# Altium footprint library Library.PcbLib: 298 footprints (part 10 of 19)
Each footprint in its own frame and in the unit in brackets; x right, y up, seen from the top. Pads: shape width x height; smd on the part's side, far side on the other; paste and mask are expansions set on the pad; w line width, h text height; cw(c..) or ccw(c..) is an arc to the next point about the centre after c.
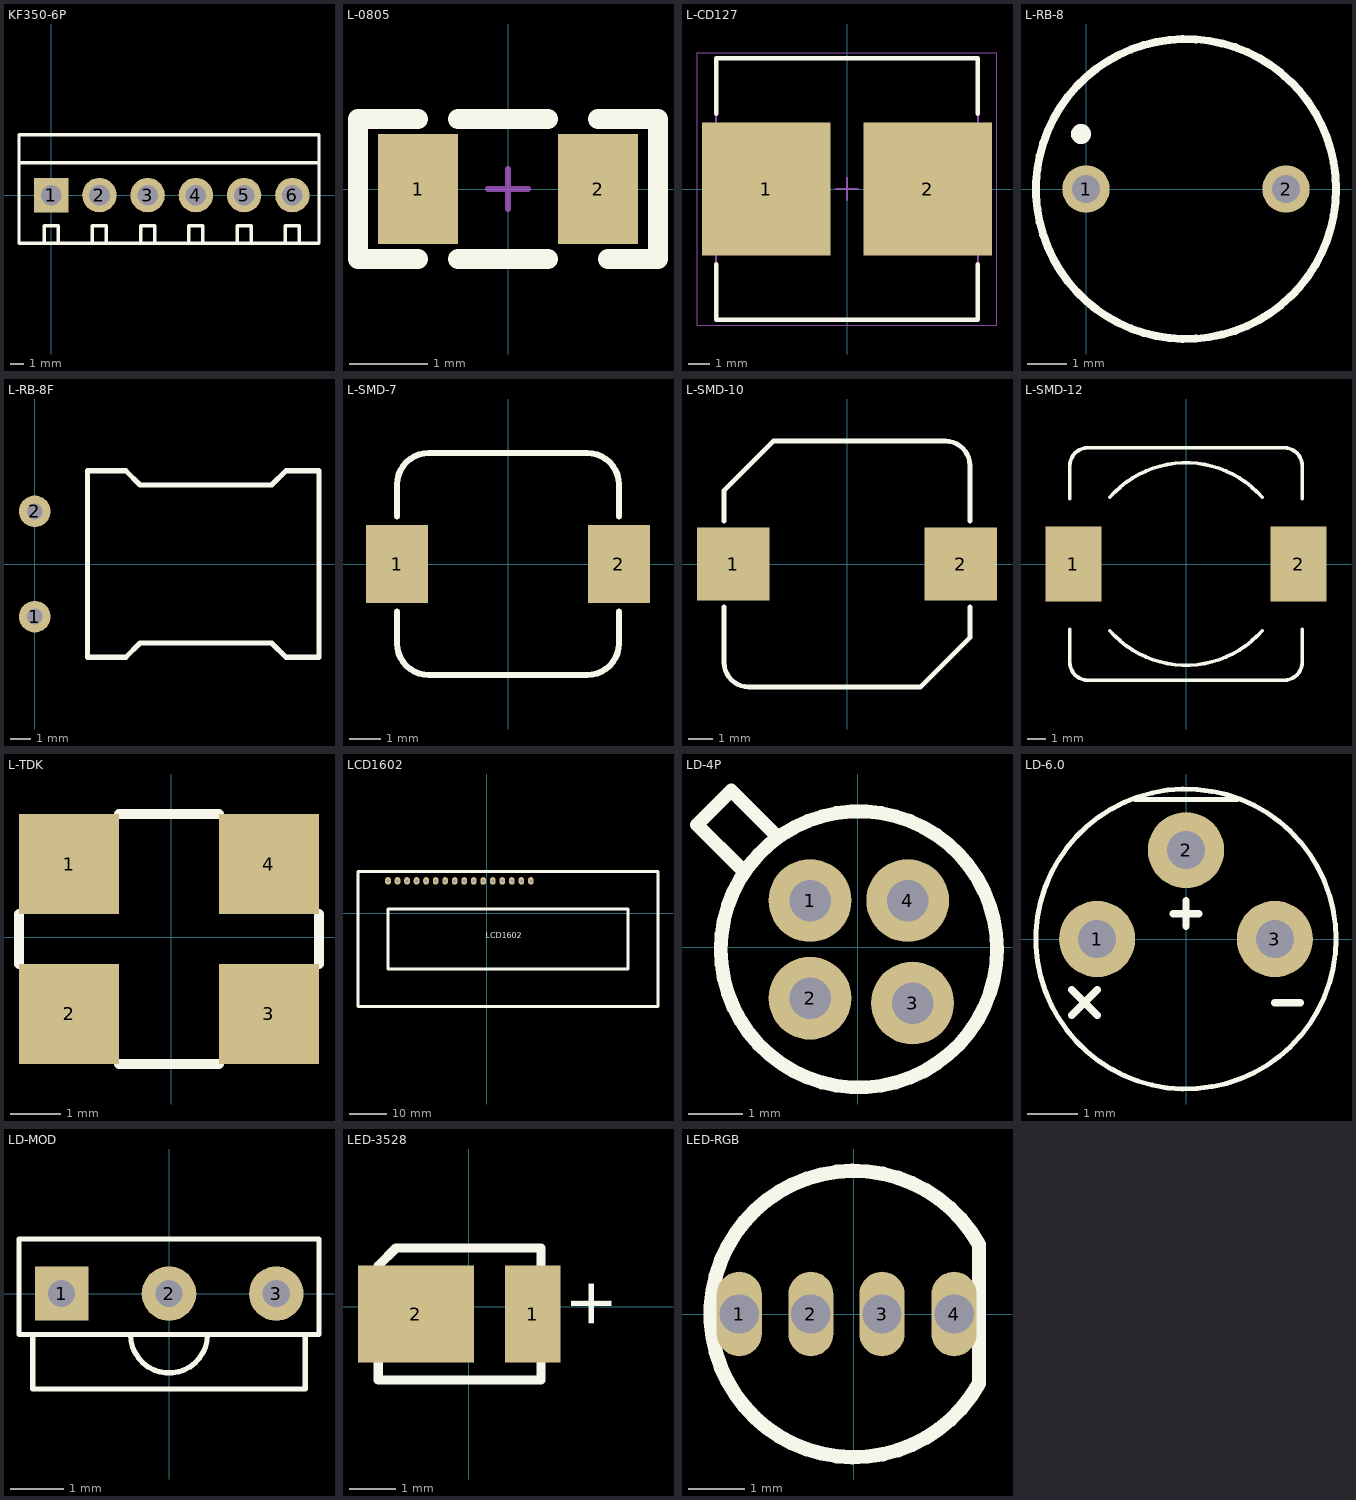
[diagram p9: the footprints below, top view; thin cyan lines are the x and y axes]

## KF350-6P [mm] "可拼接端子/10A"
pads (6):
  rect 2.5x2.5 hole 1.5: 1(0,0)
  round 2.5 hole 1.5: 2(3.5,0) 3(7,0) 4(10.5,0) 5(14,0) 6(17.5,0)
Top Overlay:
  lines w0.254: -2.337,2.337 19.41,2.337 ; -0.508,-3.48 -0.508,-2.21 0.508,-2.21 0.508,-3.48 ; 2.992,-3.48 2.992,-2.21 4.008,-2.21 4.008,-3.48 ; 6.492,-3.48 6.492,-2.21 7.508,-2.21 7.508,-3.48 ; 9.992,-3.48 9.992,-2.21 11.008,-2.21 11.008,-3.48 ; 13.492,-3.48 13.492,-2.21 14.508,-2.21 14.508,-3.48 ; 16.993,-3.48 16.993,-2.21 18.009,-2.21 18.009,-3.48 ; -2.337,-3.48 -2.337,4.369 19.436,4.369 19.436,-3.48 -2.337,-3.48
3D body "KF350.STEP": height 10, standoff -3.8, extent 15.35,-3.3 19.25,4.2
3D body "KF350.STEP": height 10, standoff -3.8, extent 11.85,-3.3 15.75,4.2
3D body "KF350.STEP": height 10, standoff -3.8, extent 8.35,-3.3 12.25,4.2
3D body "KF350.STEP": height 10, standoff -3.8, extent 4.85,-3.3 8.75,4.2
3D body "KF350.STEP": height 10, standoff -3.8, extent 1.35,-3.3 5.25,4.2
3D body "KF350.STEP": height 10, standoff -3.8, extent -2.15,-3.3 1.75,4.2

## KONG [mm]
via 1.419,-1.496 diameter 0.6 hole 0.3
via -1.581,-1.496 diameter 0.6 hole 0.3
via 1.419,1.504 diameter 0.6 hole 0.3
via -1.581,1.504 diameter 0.6 hole 0.3
via -2.081,0.004 diameter 0.6 hole 0.3
via -0.081,-1.996 diameter 0.6 hole 0.3
via 1.919,0.004 diameter 0.6 hole 0.3
via -0.081,2.004 diameter 0.6 hole 0.3
via -0.081,0.004 diameter 5 hole 3.2

## L-0805 [mil] "小功率贴片电感"
pads (2):
  rect 40x55 smd: 1(-45,0) 2(45,0)
Top Overlay:
  lines w10: -45,-35 -75,-35 -75,35 -45,35 ; -25,-35 20,-35 ; -25,35 20,35 ; 45,35 75,35 75,-35 50,-35
Mechanical 15:
  lines w3: -10,0 10,0 ; 0,-10 0,10
3D body "0805.STEP": height 35.43, standoff -0.11, extent -39.37,-23.62 39.37,23.62

## L-CD127 [mm]
pads (2):
  rect 5.9x6.1 smd: 1(-3.7,0) 2(3.7,0)
Top Overlay:
  lines w0.2: -6,-3.45 -6,-6 6,-6 6,-3.45 ; -6,3.45 -6,6 6,6 6,3.45
Mechanical 13:
  lines w0.1: -6,-6 6,-6 6,6 -6,6 -6,-6
Mechanical 15:
  lines w0.05: -6.875,-6.25 6.875,-6.25 6.875,6.25 -6.875,6.25 -6.875,-6.25
  lines w0.1: -0.5,0 0.5,0 ; 0,-0.5 0,0.5
3D body "CDRH127.STEP": height 7.8, standoff 0, extent -6,-6 6,6

## L-RB-8 [mm] "Inductor"
pads (2):
  round 1.2 hole 0.7: 1(0,0) 2(5.08,0)
Top Overlay:
  circle w0.2: c2.54,0 r3.81
  circle w0.254: c-0.127,1.397 r0.127

## L-RB-8F [mil] "ֱ?"
height 472.44
pads (2):
  round 60 hole 30: 1(0,-100) 2(0,100)
Top Overlay:
  lines w10: 100,-177.17 100,177.17 172.83,177.17 200,150 450,150 477.17,177.17 540,177.17 540,-177.17 477.17,-177.17 450,-150 200,-150 172.83,-177.17 100,-177.17

## L-SMD-7 [mm] "贴片电感7*7"
pads (2):
  rect 2x2.5 smd: 1(-3.556,0) 2(3.556,0)
Top Overlay:
  lines w0.2: -3.556,-1.524 -3.556,-2.54 ccw(c-2.54,-2.54) -2.54,-3.556 2.54,-3.556 ccw(c2.54,-2.54) 3.556,-2.54 3.556,-1.524 ; -3.556,1.524 -3.556,2.54 cw(c-2.54,2.54) -2.54,3.556 2.54,3.556 cw(c2.54,2.54) 3.556,2.54 3.556,1.524
3D body: height 4, standoff 0, extent -3.556,-3.556 3.556,3.556

## L-SMD-10 [mm] "贴片电感10*10"
pads (2):
  rect 3x3 smd: 1(-4.699,0) 2(4.699,0)
Top Overlay:
  lines w0.2: -5.08,-1.778 -5.08,-4.064 ccw(c-4.064,-4.064) -4.064,-5.08 3.048,-5.08 5.08,-3.048 5.08,-1.778 ; -5.08,1.778 -5.08,3.048 -3.048,5.08 4.064,5.08 cw(c4.064,4.064) 5.08,4.064 5.08,1.778
3D body: height 4, standoff 0, extent -5.08,-5.08 5.08,5.08

## L-SMD-12 [mm] "贴片电感12*12"
height 4
pads (2):
  rect 3x4 smd: 1(-6,0) 2(6,0)
Top Overlay:
  lines w0.2: -6.2,-3.475 -6.2,-5.23 ccw(c-5.23,-5.23) -5.23,-6.2 5.23,-6.2 ccw(c5.23,-5.23) 6.2,-5.23 6.2,-3.475 ; -6.2,3.475 -6.2,5.23 cw(c-5.23,5.23) -5.23,6.2 5.23,6.2 cw(c5.23,5.23) 6.2,5.23 6.2,3.475 ; -4.064,-3.556 ccw(c0,0) 4.064,-3.556 ; -4.064,3.556 cw(c0,0) 4.064,3.556
3D body: height 0.6, standoff 0, extent -6.198,-6.223 6.198,6.172
3D body: height 2.5, standoff 0.3, extent -5.273,-5.303 5.315,5.29

## L-TDK [mm]
height 10
pads (4):
  rect 2x2 smd: 1(-2.048,1.46) 2(-2.048,-1.54) 3(1.952,-1.54) 4(1.952,1.46)
Top Overlay:
  lines w0.2: -3.048,-0.54 -3.048,0.46 ; -1.048,-2.54 0.952,-2.54 ; -1.048,2.46 0.952,2.46 ; 2.952,-0.54 2.952,0.46

## LCD1602 [mil]
pads (16):
  oval 60x80 hole 30: 1(-1039.04,338.57) 2(-939.04,338.57) 3(-839.04,338.57) 4(-739.04,338.57) 5(-639.04,338.57) 6(-539.04,338.57) 7(-439.04,338.57) 8(-339.04,338.57) 9(-239.04,338.57) 10(-139.04,338.57) 11(-39.04,338.57) 12(60.96,338.57) 13(160.96,338.57) 14(260.96,338.57) 15(360.96,338.57) 16(460.96,338.57)
Top Overlay:
  lines w30: -1354,-980.32 -1354,437 1795.61,437 1795.61,-980.32 -1354,-980.32 ; -1039.04,-586.62 -1039.04,43.3 1480.65,43.3 1480.65,-586.62 -1039.04,-586.62
  text "LCD1602" at -14,-263 h60
3D body "1602LCD.STEP": height 354.33, standoff -145.67, extent -1354.8,-953.97 1794.81,423.98

## LD-4P [mil]
pads (4):
  round 60 hole 30: 1(-34.71,33.93) 2(-34.71,-36.78) 3(39.54,-40.33) 4(35.98,33.92)
Top Overlay:
  circle w10: c0.64,-1.43 r100
  lines w9.84: -84.75,57.04 -116.57,88.86 -91.82,113.61 -60,81.79

## LD-6.0 [mil] "激光直?"
height 511.81
pads (3):
  round 60 hole 30: 1(-70,0) 2(0,70) 3(70,0)
Top Overlay:
  circle w3.94: c0,0 r118.11
  lines w3.94: -40,110 40,110
  lines w5.91: -90,-60 -70,-40 ; -90,-40 -70,-60 ; -10,20 10,20 ; 0,10 0,30 ; 70,-50 90,-50

## LD-MOD [mm] "激光"
height 5
pads (3):
  rect 1x1 hole 0.5: 1(-2,0)
  round 1.016 hole 0.5: 2(0,0)
  round 1.016 hole 0.508: 3(2,0)
Top Overlay:
  lines w0.1: -2.54,-0.762 -2.54,-1.778 2.54,-1.778 2.54,-0.762 ; -0.718,-0.762 ccw(c0,-0.762) 0.718,-0.762 ; -2.794,-0.762 -2.794,1.016 2.794,1.016 2.794,-0.762 -2.794,-0.762

## LED-3528 [mm] "贴片二极管"
height 3
pads (2):
  rect 1.2x2.1 smd: 1(1.378,-0.154)
  rect 2.5x2.1 smd: 2(-1.136,-0.154)
Top Overlay:
  lines w0.2: -1.949,-1.576 -1.949,0.888 -1.568,1.269 1.556,1.269 1.556,-1.576 -1.949,-1.576
  text "+" at 3.08,-0.509 h1
3D body "LED3528.step": height 1.8, standoff 0, extent -1.972,-1.554 1.528,1.246

## LED-RGB [mm] "三基色二极管"
height 6
pads (4):
  oval 0.8x1.5 hole 0.7: 1(-2.032,0) 2(-0.762,0) 3(0.5,0) 4(1.778,0)
Top Overlay:
  lines w0.254: 2.22,-1.234 cw(c0,0) 2.22,1.234 2.22,-1.234